# Altium footprint library Horizont_11_12_2017.PcbLib: 257 footprints (part 9 of 17)
Each footprint in its own frame and in the unit in brackets; x right, y up, seen from the top. Pads: shape width x height; smd on the part's side, far side on the other; paste and mask are expansions set on the pad; w line width, h text height; cw(c..) or ccw(c..) is an arc to the next point about the centre after c.
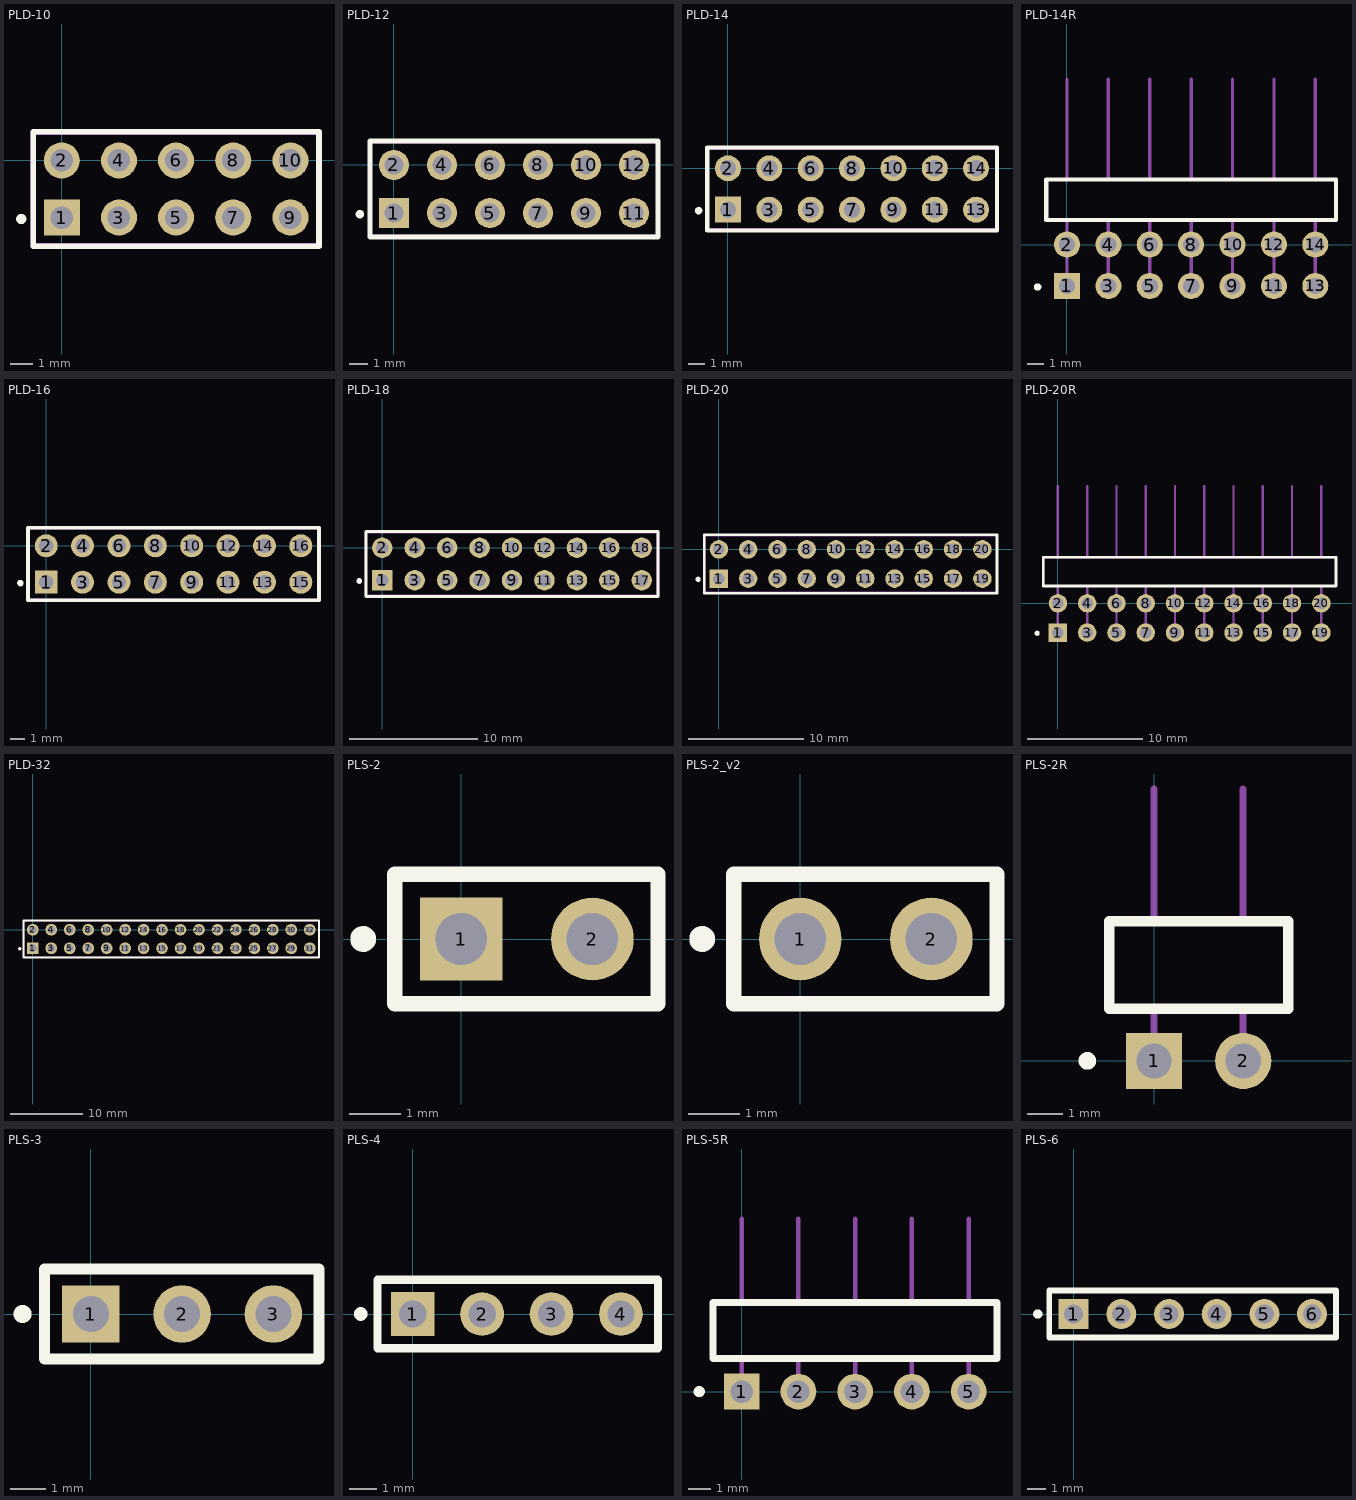
[diagram p8: the footprints below, top view; thin cyan lines are the x and y axes]

## PLD-10 [mm]
height 8.4
pads (10):
  rect 1.6x1.6 hole 1: 1(0,-2.54)
  round 1.6 hole 1: 2(0,0) 3(2.54,-2.54) 4(2.54,0) 5(5.08,-2.54) 6(5.08,0) 7(7.62,-2.54) 8(7.62,0) 9(10.16,-2.54) 10(10.16,0)
Top Overlay:
  circle w0.25: c-1.8,-2.6 r0.1
  lines w0.25: -1.27,-3.81 11.43,-3.81 11.43,1.27 -1.27,1.27 -1.27,-3.81
Mechanical 1:
  lines w0.2: -1.28,-3.77 11.43,-3.77 11.43,1.23 -1.28,1.23 -1.28,-3.77
  text "9" at 9.485,-2.95 h1.5
  text "1" at -0.254,-3.302 h1.5
  text "10" at 9.503,-0.462 h1.5
  text "2" at -0.508,-0.762 h1.5
  text ".Designator" at 3.92,-1.52 h1.5
3D body "PLD-10.stp": height 8.8, standoff -3, extent -1.27,-3.81 11.43,1.27

## PLD-12 [mm]
height 8.8
pads (12):
  rect 1.6x1.6 hole 1: 1(0,-2.54)
  round 1.6 hole 1: 2(0,0) 3(2.54,-2.54) 4(2.54,0) 5(5.08,-2.54) 6(5.08,0) 7(7.62,-2.54) 8(7.62,0) 9(10.16,-2.54) 10(10.16,0) 11(12.7,-2.54) 12(12.7,0)
Top Overlay:
  circle w0.25: c-1.8,-2.6 r0.1
  lines w0.25: -1.27,-3.81 -1.27,1.27 13.97,1.27 13.97,-3.81 -1.27,-3.81
Mechanical 1:
  lines w0.2: -1.28,-3.77 -1.28,1.23 13.97,1.23 13.97,-3.77 -1.28,-3.77
  text ".Designator" at 5.19,-1.52 h1.5
  text "2" at -0.508,-0.762 h1.5
  text "12" at 12.203,-0.462 h1.5
  text "1" at -0.254,-3.302 h1.5
  text "11" at 12.185,-2.95 h1.5
3D body "PLD-12.stp": height 8.8, standoff -3, extent -1.27,-3.81 13.97,1.27

## PLD-14 [mm]
height 8.8
pads (14):
  rect 1.6x1.6 hole 1: 1(0,-2.54)
  round 1.6 hole 1: 2(0,0) 3(2.54,-2.54) 4(2.54,0) 5(5.08,-2.54) 6(5.08,0) 7(7.62,-2.54) 8(7.62,0) 9(10.16,-2.54) 10(10.16,0) 11(12.7,-2.54) 12(12.7,0) 13(15.24,-2.54) 14(15.24,0)
Top Overlay:
  circle w0.25: c-1.8,-2.6 r0.1
  lines w0.25: -1.27,-3.81 16.51,-3.81 16.51,1.27 -1.27,1.27 -1.27,-3.81
Mechanical 1:
  lines w0.2: -1.28,-3.77 16.52,-3.77 16.52,1.23 -1.28,1.23 -1.28,-3.77
  text "13" at 14.725,-2.95 h1.5
  text "1" at -0.254,-3.302 h1.5
  text "14" at 14.743,-0.462 h1.5
  text "2" at -0.508,-0.762 h1.5
  text ".Designator" at 6.46,-1.52 h1.5
3D body "PLD-14.stp": height 8.8, standoff -3, extent -1.28,-3.77 16.5,1.23

## PLD-14R [mm]
height 5.08
pads (14):
  rect 1.6x1.6 hole 1: 1(0,-2.54)
  round 1.6 hole 1: 2(0,0) 3(2.54,-2.54) 4(2.54,0) 5(5.08,-2.54) 6(5.08,0) 7(7.62,-2.54) 8(7.62,0) 9(10.16,-2.54) 10(10.16,0) 11(12.7,-2.54) 12(12.7,0) 13(15.24,-2.54) 14(15.24,0)
Top Overlay:
  circle w0.25: c-1.8,-2.6 r0.1
  lines w0.25: -1.27,1.5 16.51,1.5 16.51,4 -1.27,4 -1.27,1.5
Mechanical 1:
  lines w0.2: 0,-2.54 0,1.5 ; 0,4 0,10.16 ; 2.54,-2.54 2.54,1.5 ; 2.54,4 2.54,10.16 ; 5.08,-2.54 5.08,1.5 ; 5.08,4 5.08,10.16 ; 7.62,-2.54 7.62,1.5 ; 7.62,4 7.62,10.16 ; 10.16,-2.54 10.16,1.5 ; 10.16,4 10.16,10.16 ; 12.7,-2.54 12.7,1.5 ; 12.7,4 12.7,10.16 ; 15.24,-2.54 15.24,1.5 ; 15.24,4 15.24,10.16 ; -1.28,1.5 16.51,1.5 16.51,4 -1.28,4 -1.28,1.5
  text "13" at 16.58,-2.9 h1.5
  text "1" at -1.8,-3 h1.5
  text "14" at 16.48,-0.5 h1.5
  text "2" at -2,-0.5 h1.5
  text ".Designator" at 4.445,2.54 h1.5
3D body "PLD-14R.stp": height 5.31, standoff -2.77, extent -1.27,-2.85 16.51,10.04

## PLD-16 [mm]
height 8.8
pads (16):
  rect 1.6x1.6 hole 1: 1(0,-2.54)
  round 1.6 hole 1: 2(0,0) 3(2.54,-2.54) 4(2.54,0) 5(5.08,-2.54) 6(5.08,0) 7(7.62,-2.54) 8(7.62,0) 9(10.16,-2.54) 10(10.16,0) 11(12.7,-2.54) 12(12.7,0) 13(15.24,-2.54) 14(15.24,0) 15(17.78,-2.54) 16(17.78,0)
Top Overlay:
  circle w0.25: c-1.8,-2.6 r0.1
  lines w0.25: -1.27,-3.81 19.05,-3.81 19.05,1.27 -1.27,1.27 -1.27,-3.81
Mechanical 1:
  lines w0.2: -1.28,-3.77 19.05,-3.77 19.05,1.23 -1.28,1.23 -1.28,-3.77
  text "15" at 17.265,-2.95 h1.5
  text "1" at -0.254,-3.302 h1.5
  text "16" at 17.283,-0.462 h1.5
  text "2" at -0.508,-0.762 h1.5
  text ".Designator" at 7.73,-1.52 h1.5
3D body "PLD-16.stp": height 8.8, standoff -3, extent -1.27,-3.81 19.05,1.27

## PLD-18 [mm]
height 8.8
pads (18):
  rect 1.6x1.6 hole 1: 1(0,-2.54)
  round 1.6 hole 1: 2(0,0) 3(2.54,-2.54) 4(2.54,0) 5(5.08,-2.54) 6(5.08,0) 7(7.62,-2.54) 8(7.62,0) 9(10.16,-2.54) 10(10.16,0) 11(12.7,-2.54) 12(12.7,0) 13(15.24,-2.54) 14(15.24,0) 15(17.78,-2.54) 16(17.78,0) 17(20.32,-2.54) 18(20.32,0)
Top Overlay:
  circle w0.25: c-1.8,-2.6 r0.1
  lines w0.25: -1.27,-3.81 -1.27,1.27 21.59,1.27 21.59,-3.81 -1.27,-3.81
Mechanical 1:
  lines w0.2: -1.28,-3.77 -1.28,1.23 21.59,1.23 21.59,-3.77 -1.28,-3.77
  text ".Designator" at 9,-1.52 h1.5
  text "2" at -0.508,-0.762 h1.5
  text "18" at 19.823,-0.462 h1.5
  text "1" at -0.254,-3.302 h1.5
  text "17" at 19.805,-2.95 h1.5
3D body "PLD-18.stp": height 8.8, standoff -3, extent -1.27,-3.81 21.59,1.27

## PLD-20 [mm]
height 8.8
pads (20):
  rect 1.6x1.6 hole 1: 1(0,-2.54)
  round 1.6 hole 1: 2(0,0) 3(2.54,-2.54) 4(2.54,0) 5(5.08,-2.54) 6(5.08,0) 7(7.62,-2.54) 8(7.62,0) 9(10.16,-2.54) 10(10.16,0) 11(12.7,-2.54) 12(12.7,0) 13(15.24,-2.54) 14(15.24,0) 15(17.78,-2.54) 16(17.78,0) 17(20.32,-2.54) 18(20.32,0) 19(22.86,-2.54) 20(22.86,0)
Top Overlay:
  circle w0.25: c-1.8,-2.6 r0.1
  lines w0.25: -1.27,-3.81 -1.27,1.27 24.13,1.27 24.13,-3.81 -1.27,-3.81
Mechanical 1:
  lines w0.2: -1.28,-3.77 -1.28,1.23 24.13,1.23 24.13,-3.77 -1.28,-3.77
  text ".Designator" at 9,-1.52 h1.5
  text "2" at -0.508,-0.762 h1.5
  text "20" at 22.363,-0.462 h1.5
  text "1" at -0.254,-3.302 h1.5
  text "19" at 22.345,-2.95 h1.5
3D body "PLD-20.stp": height 8.8, standoff -3, extent -1.27,-3.81 24.13,1.27

## PLD-20R [mm]
height 5.08
pads (20):
  rect 1.6x1.6 hole 1: 1(0,-2.54)
  round 1.6 hole 1: 2(0,0) 3(2.54,-2.54) 4(2.54,0) 5(5.08,-2.54) 6(5.08,0) 7(7.62,-2.54) 8(7.62,0) 9(10.16,-2.54) 10(10.16,0) 11(12.7,-2.54) 12(12.7,0) 13(15.24,-2.54) 14(15.24,0) 15(17.78,-2.54) 16(17.78,0) 17(20.32,-2.54) 18(20.32,0) 19(22.86,-2.54) 20(22.86,0)
Top Overlay:
  circle w0.25: c-1.8,-2.6 r0.1
  lines w0.25: -1.27,1.5 24.13,1.5 24.13,4 -1.27,4 -1.27,1.5
Mechanical 1:
  lines w0.2: 0,-2.54 0,1.5 ; 0,4 0,10.16 ; 2.54,-2.54 2.54,1.5 ; 2.54,4 2.54,10.16 ; 5.08,-2.54 5.08,1.5 ; 5.08,4 5.08,10.16 ; 7.62,-2.54 7.62,1.5 ; 7.62,4 7.62,10.16 ; 10.16,-2.54 10.16,1.5 ; 10.16,4 10.16,10.16 ; 12.7,-2.54 12.7,1.5 ; 12.7,4 12.7,10.16 ; 15.24,-2.54 15.24,1.5 ; 15.24,4 15.24,10.16 ; 17.78,-2.54 17.78,1.5 ; 17.78,4 17.78,10.16 ; 20.32,-2.54 20.32,1.5 ; 20.32,4 20.32,10.16 ; 22.86,-2.54 22.86,1.5 ; 22.86,4 22.86,10.16 ; -1.28,1.5 24.13,1.5 24.13,4 -1.28,4 -1.28,1.5
  text "19" at 24.2,-2.9 h1.5
  text "19" at 24.2,-2.9 h1.5
  text "1" at -1.8,-3 h1.5
  text "20" at 24.1,-0.5 h1.5
  text "2" at -2,-0.5 h1.5
  text ".Designator" at 8.8,2.5 h1.5
3D body "PLD-20R.stp": height 5.31, standoff -2.77, extent -1.27,-2.85 24.13,10.04

## PLD-32 [mm]
height 8.8
pads (32):
  rect 1.6x1.6 hole 1: 1(0,-2.54)
  round 1.6 hole 1: 2(0,0) 3(2.54,-2.54) 4(2.54,0) 5(5.08,-2.54) 6(5.08,0) 7(7.62,-2.54) 8(7.62,0) 9(10.16,-2.54) 10(10.16,0) 11(12.7,-2.54) 12(12.7,0) 13(15.24,-2.54) 14(15.24,0) 15(17.78,-2.54) 16(17.78,0) 17(20.32,-2.54) 18(20.32,0) 19(22.86,-2.54) 20(22.86,0) 21(25.4,-2.54) 22(25.4,0) 23(27.94,-2.54) 24(27.94,0) 25(30.48,-2.54) 26(30.48,0) 27(33.02,-2.54) 28(33.02,0) 29(35.56,-2.54) 30(35.56,0) 31(38.1,-2.54) 32(38.1,0)
Top Overlay:
  circle w0.25: c-1.8,-2.6 r0.1
  lines w0.25: -1.27,-3.81 39.37,-3.81 39.37,1.27 -1.27,1.27 -1.27,-3.81
Mechanical 1:
  lines w0.2: -1.28,-3.77 39.37,-3.77 39.37,1.23 -1.28,1.23 -1.28,-3.77
  text "31" at 37.585,-2.95 h1.5
  text "1" at -0.254,-3.302 h1.5
  text "32" at 37.603,-0.462 h1.5
  text "2" at -0.508,-0.762 h1.5
  text ".Designator" at 17.89,-1.52 h1.5
3D body "PLD-32.stp": height 8.8, standoff -3, extent -1.27,-3.81 39.37,1.27

## PLS-2 [mm]
height 8
pads (2):
  rect 1.6x1.6 hole 1: 1(0,0)
  round 1.6 hole 1: 2(2.54,0)
Top Overlay:
  circle w0.3: c-1.9,0 r0.1
  lines w0.3: -1.29,-1.25 -1.29,1.25 3.81,1.25 3.81,-1.25 -1.29,-1.25
Mechanical 1:
  lines w0.2: -1.29,-1.25 -1.29,1.25 3.81,1.25 3.81,-1.25 -1.29,-1.25
  text "1" at -0.254,-0.508 h1.5
  text "2" at 2.286,-0.381 h1.5
  text ".Designator" at 0.127,1.905 h1.5
3D body "PLS-2.stp": height 8.8, standoff -3, extent -1.27,-1.27 3.81,1.27

## PLS-2_v2 [mm]
height 8
pads (2):
  round 1.6 hole 1: 1(0,0) 2(2.54,0)
Top Overlay:
  circle w0.3: c-1.9,0 r0.1
  lines w0.3: -1.29,-1.25 3.81,-1.25 3.81,1.25 -1.29,1.25 -1.29,-1.25
Mechanical 1:
  lines w0.2: -1.29,-1.25 3.81,-1.25 3.81,1.25 -1.29,1.25 -1.29,-1.25
  text ".Designator" at 0.127,1.905 h1.5
  text "2" at 2.286,-0.381 h1.5
  text "1" at -0.254,-0.508 h1.5
3D body "PLS-2.stp": height 8.8, standoff -3, extent -1.27,-1.27 3.81,1.27

## PLS-2R [mm]
height 2.5
pads (2):
  rect 1.6x1.6 hole 1: 1(0,0)
  round 1.6 hole 1: 2(2.54,0)
Top Overlay:
  circle w0.3: c-1.9,0 r0.1
  lines w0.3: -1.28,1.485 3.82,1.485 3.82,3.985 -1.28,3.985 -1.28,1.485
Mechanical 1:
  lines w0.2: 0,0 0,1.49 ; 0,3.985 0,7.747 ; 2.54,0 2.54,1.485 ; 2.54,3.985 2.54,7.747 ; -1.28,1.485 3.82,1.485 3.82,3.985 -1.28,3.985 -1.28,1.485
  text ".Designator" at -0.889,-2.032 h1.5
  text "2" at 2.286,-0.381 h1.5
  text "1" at -0.254,-0.508 h1.5
3D body "PLS-2R.stp": height 2.52, standoff -3.55, extent -1.27,-0.32 3.81,7.79

## PLS-3 [mm]
height 8
pads (3):
  rect 1.6x1.6 hole 1: 1(0,0)
  round 1.6 hole 1: 2(2.54,0) 3(5.08,0)
Top Overlay:
  circle w0.3: c-1.9,0 r0.1
  lines w0.3: -1.29,-1.25 6.35,-1.25 6.35,1.25 -1.29,1.25 -1.29,-1.25
Mechanical 1:
  lines w0.2: -1.29,-1.25 6.35,-1.25 6.35,1.25 -1.29,1.25 -1.29,-1.25
  text ".Designator" at 1.397,1.905 h1.5
  text "3" at 4.826,-0.381 h1.5
  text "1" at -0.254,-0.508 h1.5
3D body "PLS-3.stp": height 8.8, standoff -3, extent -1.27,-1.27 6.35,1.27

## PLS-4 [mm]
height 8.8
pads (4):
  rect 1.6x1.6 hole 1: 1(0,0)
  round 1.6 hole 1: 2(2.54,0) 3(5.08,0) 4(7.62,0)
Top Overlay:
  circle w0.3: c-1.9,0 r0.1
  lines w0.3: -1.29,-1.25 8.975,-1.25 8.975,1.25 -1.29,1.25 -1.29,-1.25
Mechanical 1:
  lines w0.2: -1.29,-1.25 -1.29,1.25 8.95,1.25 8.95,-1.25 -1.29,-1.25
  text ".Designator" at 0.725,1.825 h1.5
  text "6" at 7.3,-0.475 h1.5
  text "1" at -0.254,-0.508 h1.5
3D body "User Library-1x4 TH Pitch 2_54mm.STEP": height 9.2, standoff -3.5, extent -1.26,-1.32 8.9,1.22

## PLS-5R [mm]
height 2.5
pads (5):
  rect 1.6x1.6 hole 1: 1(0,0)
  round 1.6 hole 1: 2(2.54,0) 3(5.08,0) 4(7.62,0) 5(10.16,0)
Top Overlay:
  circle w0.3: c-1.9,0 r0.1
  lines w0.3: -1.28,1.485 11.43,1.485 11.43,3.985 -1.28,3.985 -1.28,1.485
Mechanical 1:
  lines w0.2: 0,0 0,1.49 ; 0,3.985 0,7.747 ; 2.54,0 2.54,1.485 ; 2.54,3.985 2.54,7.747 ; 5.08,0 5.08,1.485 ; 5.08,3.985 5.08,7.747 ; 7.62,0 7.62,1.485 ; 7.62,3.985 7.62,7.747 ; 10.16,0 10.16,1.485 ; 10.16,3.985 10.16,7.747 ; -1.28,1.485 11.43,1.485 11.43,3.985 -1.28,3.985 -1.28,1.485
  text ".Designator" at 2.286,-2.159 h1.5
  text "1" at -0.762,2.286 h1.5
  text "5" at 10.287,2.286 h1.5
3D body "PLS-5R.stp": height 2.52, standoff -3.55, extent -1.27,-0.32 11.43,7.79

## PLS-6 [mm]
height 8.8
pads (6):
  rect 1.6x1.6 hole 1: 1(0,0)
  round 1.6 hole 1: 2(2.54,0) 3(5.08,0) 4(7.62,0) 5(10.16,0) 6(12.7,0)
Top Overlay:
  circle w0.3: c-1.9,0 r0.1
  lines w0.3: -1.29,-1.25 13.97,-1.25 13.97,1.25 -1.29,1.25 -1.29,-1.25
Mechanical 1:
  lines w0.2: -1.29,-1.25 -1.29,1.25 13.97,1.25 13.97,-1.25 -1.29,-1.25
  text ".Designator" at 4.7,-0.3 h1.5
  text "6" at 12.36,-0.45 h1.5
  text "1" at -0.254,-0.508 h1.5
3D body "PLS-6.stp": height 10, standoff -3, extent -1.27,-1.27 13.97,1.27